# Altium footprint library HW_HOLLAND_NCDM_MONITOR_R1.PcbLib: 472 footprints (part 27 of 30)
Each footprint in its own frame and in the unit in brackets; x right, y up, seen from the top. Pads: shape width x height; smd on the part's side, far side on the other; paste and mask are expansions set on the pad; w line width, h text height; cw(c..) or ccw(c..) is an arc to the next point about the centre after c.
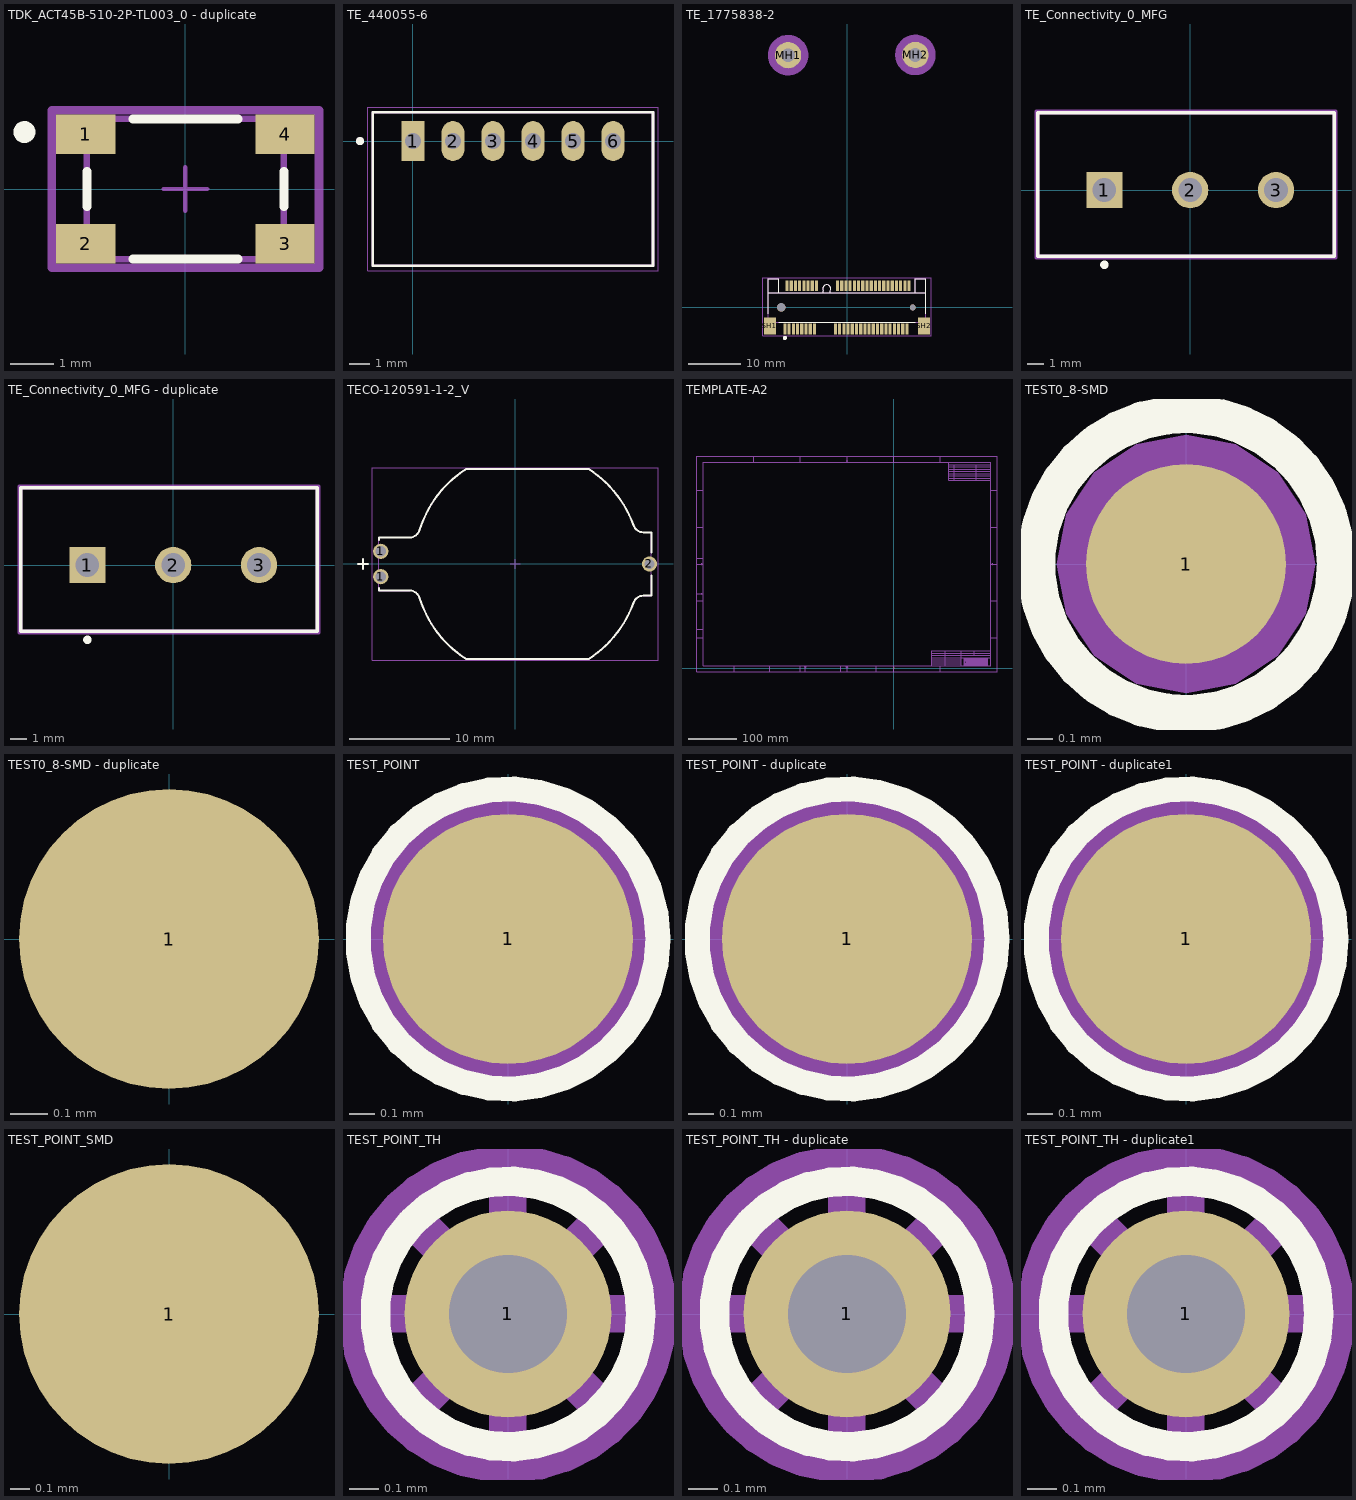
[diagram p26: the footprints below, top view; thin cyan lines are the x and y axes]

## TDK_ACT45B-510-2P-TL003_0 - duplicate [mm]
pads (4):
  rect 1.35x0.9 smd paste+0 mask+0: 1(-2.275,1.25) 2(-2.275,-1.25) 3(2.275,-1.25) 4(2.275,1.25)
Top Overlay:
  circle w0.25: c-3.675,1.3 r0.125
  lines w0.2: -2.25,-0.4 -2.25,0.4 ; -1.2,-1.6 1.2,-1.6 ; -1.2,1.6 1.2,1.6 ; 2.25,-0.4 2.25,0.4
Top Courtyard:
  lines w0.2: -3.05,-1.8 3.05,-1.8 3.05,1.8 -3.05,1.8 -3.05,-1.8
  text ".Designator" at 0,0 h1
Mechanical 12:
  lines w0.15: -2.25,-1.6 2.25,-1.6 2.25,1.6 -2.25,1.6 -2.25,-1.6
Mechanical 15:
  lines w0.1: -0.5,0 0.5,0 ; 0,-0.5 0,0.5
  lines w0.2: -3.05,-1.8 3.05,-1.8 3.05,1.8 -3.05,1.8 -3.05,-1.8
3D body "act45b.step": height 2.83, standoff 0.03, extent -2.223,-1.549 2.277,1.651

## TE_440055-6 [mm]
height 0.52
pads (6):
  rect 1.15x2 hole 0.8: 1(0,0)
  oval 1.15x2 hole 0.8: 2(2.007,0) 3(4.013,0) 4(6.02,0) 5(8.026,0) 6(10.033,0)
Top Overlay:
  circle w0.2: c-2.65,0 r0.1
  lines w0.127: -2,-6.25 12.033,-6.25 12.033,1.45 -2,1.45 -2,-6.25
Mechanical 13:
  circle w0.2: c-2.65,0 r0.1
  lines w0.127: -2,-6.25 12.033,-6.25 ; -2,-6.25 12.033,-6.25 ; -2,-6.25 -2,1.45 12.033,1.45 12.033,-6.25
Mechanical 15:
  lines w0.05: -2.25,-6.5 12.283,-6.5 12.283,1.7 -2.25,1.7 -2.25,-6.5
3D body "440055-6.stp": height 4.97, standoff -3.37, extent -1.95,-6.2 12.05,1.5

## TE_1775838-2 [mm]
pads (58):
  rect 0.6x2 smd: 1(-11.8,-4.1) 2(-11.4,4.1) 3(-11,-4.1) 4(-10.6,4.1) 5(-10.2,-4.1) 6(-9.8,4.1) 7(-9.4,-4.1) 8(-9,4.1) 9(-8.6,-4.1) 10(-8.2,4.1) 11(-7.8,-4.1) 12(-7.4,4.1) 13(-7,-4.1) 14(-6.6,4.1) 15(-6.2,-4.1) 16(-5.8,4.1) 17(-2.2,-4.1) 18(-1.8,4.1) 19(-1.4,-4.1) 20(-1,4.1) 21(-0.6,-4.1) 22(-0.2,4.1) 23(0.2,-4.1) 24(0.6,4.1) 25(1,-4.1) 26(1.4,4.1) 27(1.8,-4.1) 28(2.2,4.1) 29(2.6,-4.1) 30(3,4.1) 31(3.4,-4.1) 32(3.8,4.1) 33(4.2,-4.1) 34(4.6,4.1) 35(5,-4.1) 36(5.4,4.1) 37(5.8,-4.1) 38(6.2,4.1) 39(6.6,-4.1) 40(7,4.1) 41(7.4,-4.1) 42(7.8,4.1) 43(8.2,-4.1) 44(8.6,4.1) 45(9,-4.1) 46(9.4,4.1) 47(9.8,-4.1) 48(10.2,4.1) 49(10.6,-4.1) 50(11,4.1) 51(11.4,-4.1) 52(11.8,4.1)
  round 5 hole 2.6: MH1(-11.2,47.95) MH2(13,48)
  rect 2.3x3.2 smd: SH1(-14.65,-3.5) SH2(14.65,-3.5)
  round 1.6 hole 1.6 unplated: ""(-12.5,0)
  round 1.1 hole 1.1 unplated: ""(12.5,0)
Top Overlay:
  circle w0.4: c-11.8,-5.8 r0.2
  lines w0.127: -14.95,-1.2 -14.95,2.78 ; -13,-2.78 13,-2.78 ; -4.535,3.2 -4.535,2.78 ; -4.532,3.195 cw(c-3.85,3.542) -3.168,3.195 ; -3.165,3.2 -3.165,2.78 ; 14.95,-1.2 14.95,2.78 ; -14.95,2.78 -14.95,5.42 -12.95,5.42 -12.95,2.78 ; -14.95,2.78 -12.95,2.78 ; -12.95,2.78 -4.535,2.78 ; -4.535,2.78 -3.165,2.78 ; -3.165,2.78 12.95,2.78 ; 12.95,2.78 12.95,5.42 14.95,5.42 14.95,2.78 ; 12.95,2.78 14.95,2.78
Mechanical 1:
  circle w1.651: c13,48 r3.028
  circle w1.651: c-11.2,47.95 r3.028
Top Courtyard:
  circle w1.651: c13,48 r3.028
  circle w1.651: c-11.2,47.95 r3.028
Mechanical 12:
  text "NO ROUTE" at 10.995,50.44 h0.5
  text "NO ROUTE" at 11.249,45.106 h0.5
  text "NO ROUTE" at -12.951,45.056 h0.5
  text "NO ROUTE" at -13.205,50.39 h0.5
Mechanical 13:
  lines w0.127: -4.535,3.2 -4.535,2.78 ; -4.532,3.195 cw(c-3.85,3.542) -3.168,3.195 ; -3.165,3.2 -3.165,2.78 ; -14.95,2.78 -14.95,5.42 -12.95,5.42 -12.95,2.78 ; -14.95,2.78 -14.95,-2.78 14.95,-2.78 14.95,2.78 ; -14.95,2.78 -12.95,2.78 ; -12.95,2.78 -4.535,2.78 ; -4.535,2.78 -3.165,2.78 ; -3.165,2.78 12.95,2.78 ; 12.95,2.78 12.95,5.42 14.95,5.42 14.95,2.78 ; 12.95,2.78 14.95,2.78
Mechanical 15:
  lines w0.05: -16.05,-5.35 -16.05,5.67 16.05,5.67 16.05,-5.35 -16.05,-5.35
3D body "1775838-2.stp": height 5.61, standoff -0.64, extent -14.95,-4.58 14.95,4.5
3D body "EC25AFA-MINIPCIE.STEP": height 6.56, standoff 1.61, extent -14.1,0 15.9,50.95
3D body: height 0.03, standoff 0, extent 9.19,44.19 13,51.81
3D body: height 0.03, standoff 0, extent 13,44.19 16.81,51.81
3D body: height 0.03, standoff 0, extent -11.2,44.14 -7.39,51.76
3D body: height 0.03, standoff 0, extent -15.01,44.14 -11.2,51.76

## TE_Connectivity_0_MFG [mm]
pads (3):
  rect 2.15x2.15 hole 1.4 paste-2539.97 mask+0: 1(-5.08,0)
  round 2.15 hole 1.4 paste-2539.97 mask+0: 2(0,0) 3(5.08,0)
Top Overlay:
  circle w0.25: c-5.08,-4.425 r0.125
  lines w0.2: -9.03,-3.925 -9.03,4.575 8.53,4.575 8.53,-3.925 -9.03,-3.925
Top Courtyard:
  lines w0.2: -9.13,-4.025 -9.13,4.675 8.63,4.675 8.63,-4.025 -9.13,-4.025
  text ".Designator" at -0.25,0.325 h1
Mechanical 12:
  lines w0.2: -9.03,-3.925 -9.03,4.575 8.53,4.575 8.53,-3.925 -9.03,-3.925
Mechanical 15:
  lines w0.1: -0.75,0.325 0.25,0.325 ; -0.25,-0.175 -0.25,0.825
  lines w0.2: -9.13,-4.025 -9.13,4.675 8.63,4.675 8.63,-4.025 -9.13,-4.025
3D body "Conn_TE_Connectivity_796636-3_eec.STEP": height 0.25, standoff 0, extent -9.13,-4.025 8.63,4.675

## TE_Connectivity_0_MFG - duplicate [mm]
pads (3):
  rect 2.15x2.15 hole 1.4 paste-2539.97 mask+0: 1(-5.08,0)
  round 2.15 hole 1.4 paste-2539.97 mask+0: 2(0,0) 3(5.08,0)
Top Overlay:
  circle w0.25: c-5.08,-4.425 r0.125
  lines w0.2: -9.03,-3.925 -9.03,4.575 8.53,4.575 8.53,-3.925 -9.03,-3.925
Top Courtyard:
  lines w0.2: -9.13,-4.025 -9.13,4.675 8.63,4.675 8.63,-4.025 -9.13,-4.025
  text ".Designator" at -0.25,0.325 h1
Mechanical 12:
  lines w0.2: -9.03,-3.925 -9.03,4.575 8.53,4.575 8.53,-3.925 -9.03,-3.925
Mechanical 15:
  lines w0.1: -0.75,0.325 0.25,0.325 ; -0.25,-0.175 -0.25,0.825
  lines w0.2: -9.13,-4.025 -9.13,4.675 8.63,4.675 8.63,-4.025 -9.13,-4.025
3D body "Conn_TE_Connectivity_796636-3_eec.STEP": height 0.25, standoff 0, extent -9.13,-4.025 8.63,4.675

## TECO-120591-1-2_V [mm]
pads (3):
  round 1.52 hole 1.02: 1(-13.46,-1.27) 1(-13.46,1.27) 2(13.46,0)
Top Overlay:
  lines w0.2: -15.74,0 -14.74,0 ; -15.24,-0.5 -15.24,0.5 ; -13.65,-2.414 -13.65,-2.665 -10.557,-2.665 cw(c-10.557,-3.685) -9.572,-3.421 ; -13.65,2.414 -13.65,2.665 -10.557,2.665 ccw(c-10.557,3.685) -9.572,3.421 ; -9.571,-3.421 ccw(c1.23,0) -4.905,-9.525 7.365,-9.525 ccw(c1.23,0) 11.874,-3.883 cw(c12.845,-4.195) 12.845,-3.175 13.65,-3.175 13.65,-1.144 ; -9.571,3.421 cw(c1.231,0) -4.905,9.525 7.365,9.525 cw(c1.23,0) 11.874,3.883 ccw(c12.845,4.195) 12.845,3.175 13.65,3.175 13.65,1.144
Mechanical 13:
  lines w0.1: -9.567,3.421 cw(c-10.552,3.685) -10.552,2.665 -13.645,2.665 -13.645,-2.665 -10.552,-2.665 cw(c-10.552,-3.685) -9.567,-3.421 ccw(c1.235,0) -4.9,-9.525 7.37,-9.525 ccw(c1.235,0) 11.879,-3.883 cw(c12.85,-4.195) 12.85,-3.175 13.655,-3.175 13.655,3.175 12.85,3.175 cw(c12.85,4.195) 11.879,3.883 ccw(c1.235,0) 7.37,9.525 -4.9,9.525 ccw(c1.235,0) -9.566,3.421
Mechanical 15:
  lines w0.05: -14.32,-9.625 14.32,-9.625 14.32,9.625 -14.32,9.625 -14.32,-9.625
  lines w0.1: -0.5,0 0.5,0 ; 0,-0.5 0,0.5
3D body "c-120591-1-j1-3d.stp": height 6.41, standoff -3.04, extent -13.65,-9.525 13.655,9.525

## TEMPLATE-A2 [mil]
pads (1):
  round 60 all layers, no hole: 1(0,0)
Top Assembly:
  drawing of 2210 lines, arcs and shapes, not listed
  text "5" at -2859,-160 h45
  text "4" at -5749,-160 h45
  text "3" at -8639,-160 h45
  text "2" at -11529,-160 h45
  text "1" at -14234,-160 h45
  text "A" at -15800,10412.5 h45
  text "B" at -15800,7490 h45
  text "C" at -15800,4600 h45
  text "D" at -15800,1677.5 h45
  text "A" at 8016,15653 h45
  text "B" at 8016,12953 h45
  text "C" at 8002,9948 h45
  text "D" at 8040,6974 h45
  text "E" at 8048,3971 h45
  text "F" at 8041,1278 h45
  text "DATE" at 6880,16420 h70
  text "SHEET    OF" at 6024,909 h70
  text "6" at 5690,16931 h45
  text "VERSIONS" at 5915,16590 h70
  text "Drawn Engineer" at 5510,1108 h70
  text "Part Number" at 5510,1282 h70
  text "7" at 5696,-160 h45
  text "SIZE" at 3125,268 h70
  text "A2" at 4730,271 h70
  text "DESIGNER" at 5070,16410 h70
  text "VER" at 4645,16410 h70
  text "B" at 4700,16030 h70
  text "A" at 4700,16220 h70
  text "C" at 4700,15848 h70
  text "E" at 4700,15484 h70
  text "D" at 4700,15666 h70
  text "F" at 4700,15302 h70
  text "1:1" at 4684,422 h70
  text "SCALE" at 3122,422 h70
  text "Design Engineer" at 3119,1088 h70
  text "Board Name" at 3113,1280 h70
  text "Date" at 3122,895 h70
  text "5" at 1890,16931 h45
  text "6" at 1709,-143 h45
  text "Checker" at 3120,740 h70
  text "Version" at 3120,580 h70
  text "4" at -1910,16931 h45
  text "3" at -5704,16914 h45
  text "2" at -9556,16906 h45
  text "1" at -13424,16899 h45
  text "A" at -15800,15665 h45
  text "B" at -15800,12965 h45
  text "C" at -15800,9965 h45
  text "D" at -15800,6965 h45
  text "E" at -15800,3965 h45
  text "F" at -15800,1300 h45
  text "5" at -2859,-160 h45
  text "4" at -5749,-160 h45
  text "3" at -8639,-160 h45
  text "2" at -11529,-160 h45
  text "1" at -14234,-160 h45
  text "A" at -15800,10412.5 h45
  text "B" at -15800,7490 h45
  text "C" at -15800,4600 h45
  text "D" at -15800,1677.5 h45
  text "A" at 8016,15653 h45
  text "B" at 8016,12953 h45
  text "C" at 8002,9948 h45
  text "D" at 8040,6974 h45
  text "E" at 8048,3971 h45
  text "F" at 8041,1278 h45
  text "6" at 5690,16931 h45
  text "5" at 1890,16931 h45
  text "6" at 1708,-143 h45
  text "4" at -1910,16931 h45
  text "3" at -5704,16914 h45
  text "2" at -9556,16906 h45
  text "1" at -13424,16899 h45
  text "A" at -15800,15665 h45
  text "B" at -15800,12965 h45
  text "C" at -15800,9965 h45
  text "D" at -15800,6965 h45
  text "E" at -15800,3965 h45
  text "F" at -15800,1300 h45
  text "A" at 8016,15653 h45
  text "B" at 8016,12953 h45
  text "C" at 8002,9948 h45
  text "D" at 8040,6974 h45
  text "E" at 8048,3971 h45
  text "F" at 8041,1278 h45
  text "DATE" at 6880,16420 h70
  text "SHEET    OF" at 6024,909 h70
  text "6" at 5690,16931 h45
  text "VERSIONS" at 5915,16590 h70
  text "Part Number" at 5510,1282 h70
  text "Drawn Engineer" at 5510,1108 h70
  text "7" at 5696,-160 h45
  text "SIZE" at 3125,268 h70
  text "A2" at 4730,271 h70
  text "DESIGNER" at 5070,16410 h70
  text "VER" at 4645,16410 h70
  text "A" at 4700,16220 h70
  text "B" at 4700,16030 h70
  text "C" at 4700,15848 h70
  text "D" at 4700,15666 h70
  text "E" at 4700,15484 h70
  text "F" at 4700,15302 h70
  text "1:1" at 4684,422 h70
  text "SCALE" at 3122,422 h70
  text "Board Name" at 3113,1280 h70
  text "Design Engineer" at 3119,1088 h70
  text "Date" at 3122,895 h70
  text "5" at 1890,16931 h45
  text "Checker" at 3120,740 h70
  text "Version" at 3120,580 h70
  text "4" at -1910,16931 h45
  text "3" at -5704,16914 h45
  text "2" at -9556,16906 h45
  text "1" at -13424,16899 h45
  text "A" at -15800,15665 h45
  text "B" at -15800,12965 h45
  text "C" at -15800,9965 h45
  text "D" at -15800,6965 h45
  text "E" at -15800,3965 h45
  text "F" at -15800,1300 h45
Mechanical 17:
  text "1" at -14.4,0 h18

## TEST0_8-SMD [mil]
pads (1):
  round 31.5 smd: 1(0,0)
Top Overlay:
  circle w6: c0,0 r23.62
Top 3D Body:
  region: 20.39,0 18.84,7.8 14.42,14.42 7.8,18.84 0,20.39 -7.8,18.84 -10.02,17.36 -14.42,14.42 -18.84,7.8 -20.39,0 -18.84,-7.8 -14.42,-14.42 -10.02,-17.36 -7.8,-18.84 0,-20.39 7.8,-18.84 14.42,-14.42 18.84,-7.8
Mechanical 17:
  text "1" at -20,0 h25
3D body: height 150, standoff 0, extent -20.39,-20.39 20.39,20.39

## TEST0_8-SMD - duplicate [mil] "TEST0_8-SMD"
height 137.8
pads (1):
  round 31.5 smd: 1(0,0)
Mechanical 21:
  text "1" at 0,-16 h20

## TEST_POINT [mm]
pads (1):
  round 1 smd: 1(0,0)
Top Overlay:
  circle w0.1: c0,0 r0.6
Top Designator:
  circle w0.127: c0,0 r0.508
  lines w0.127: -0.508,0 0,0 ; -0.3,-0.3 0,0 ; -0.3,0.3 0,0 ; 0,-0.508 0,0 ; 0,0.508 0,0 ; 0.3,-0.3 0,0 ; 0.3,0.3 0,0 ; 0.508,0 0,0

## TEST_POINT - duplicate [mm]
pads (1):
  round 1 smd: 1(0,0)
Top Overlay:
  circle w0.1: c0,0 r0.6
Top Designator:
  circle w0.127: c0,0 r0.508
  lines w0.127: -0.508,0 0,0 ; -0.3,-0.3 0,0 ; -0.3,0.3 0,0 ; 0,-0.508 0,0 ; 0,0.508 0,0 ; 0.3,-0.3 0,0 ; 0.3,0.3 0,0 ; 0.508,0 0,0

## TEST_POINT - duplicate1 [mm]
height 0.52
pads (1):
  round 1 smd: 1(0,0)
Top Overlay:
  circle w0.1: c0,0 r0.6
Top Designator:
  circle w0.127: c0,0 r0.508
  lines w0.127: -0.508,0 0,0 ; -0.3,-0.3 0,0 ; -0.3,0.3 0,0 ; 0,-0.508 0,0 ; 0,0.508 0,0 ; 0.3,-0.3 0,0 ; 0.3,0.3 0,0 ; 0.508,0 0,0

## TEST_POINT_SMD [mil]
pads (1):
  round 60 smd: 1(0,0)

## TEST_POINT_TH [mm]
pads (1):
  round 0.7 hole 0.4 mask+0.05: 1(0,0)
Top Overlay:
  circle w0.1: c0,0 r0.45
Bottom Overlay:
  circle w0.1: c0,0 r0.45
Top Designator:
  circle w0.127: c0,0 r0.508
  lines w0.127: -0.508,0 0,0 ; -0.3,-0.3 0,0 ; -0.3,0.3 0,0 ; 0,-0.508 0,0 ; 0,0.508 0,0 ; 0.3,-0.3 0,0 ; 0.3,0.3 0,0 ; 0.508,0 0,0

## TEST_POINT_TH - duplicate [mm]
pads (1):
  round 0.7 hole 0.4 mask+0.05: 1(0,0)
Top Overlay:
  circle w0.1: c0,0 r0.45
Bottom Overlay:
  circle w0.1: c0,0 r0.45
Top Designator:
  circle w0.127: c0,0 r0.508
  lines w0.127: -0.508,0 0,0 ; -0.3,-0.3 0,0 ; -0.3,0.3 0,0 ; 0,-0.508 0,0 ; 0,0.508 0,0 ; 0.3,-0.3 0,0 ; 0.3,0.3 0,0 ; 0.508,0 0,0

## TEST_POINT_TH - duplicate1 [mm]
pads (1):
  round 0.7 hole 0.4 mask+0.05: 1(0,0)
Top Overlay:
  circle w0.1: c0,0 r0.45
Bottom Overlay:
  circle w0.1: c0,0 r0.45
Top Designator:
  circle w0.127: c0,0 r0.508
  lines w0.127: -0.508,0 0,0 ; -0.3,-0.3 0,0 ; -0.3,0.3 0,0 ; 0,-0.508 0,0 ; 0,0.508 0,0 ; 0.3,-0.3 0,0 ; 0.3,0.3 0,0 ; 0.508,0 0,0